# Altium footprint library FS_Footprints.PcbLib: 134 footprints (part 7 of 9)
Each footprint in its own frame and in the unit in brackets; x right, y up, seen from the top. Pads: shape width x height; smd on the part's side, far side on the other; paste and mask are expansions set on the pad; w line width, h text height; cw(c..) or ccw(c..) is an arc to the next point about the centre after c.
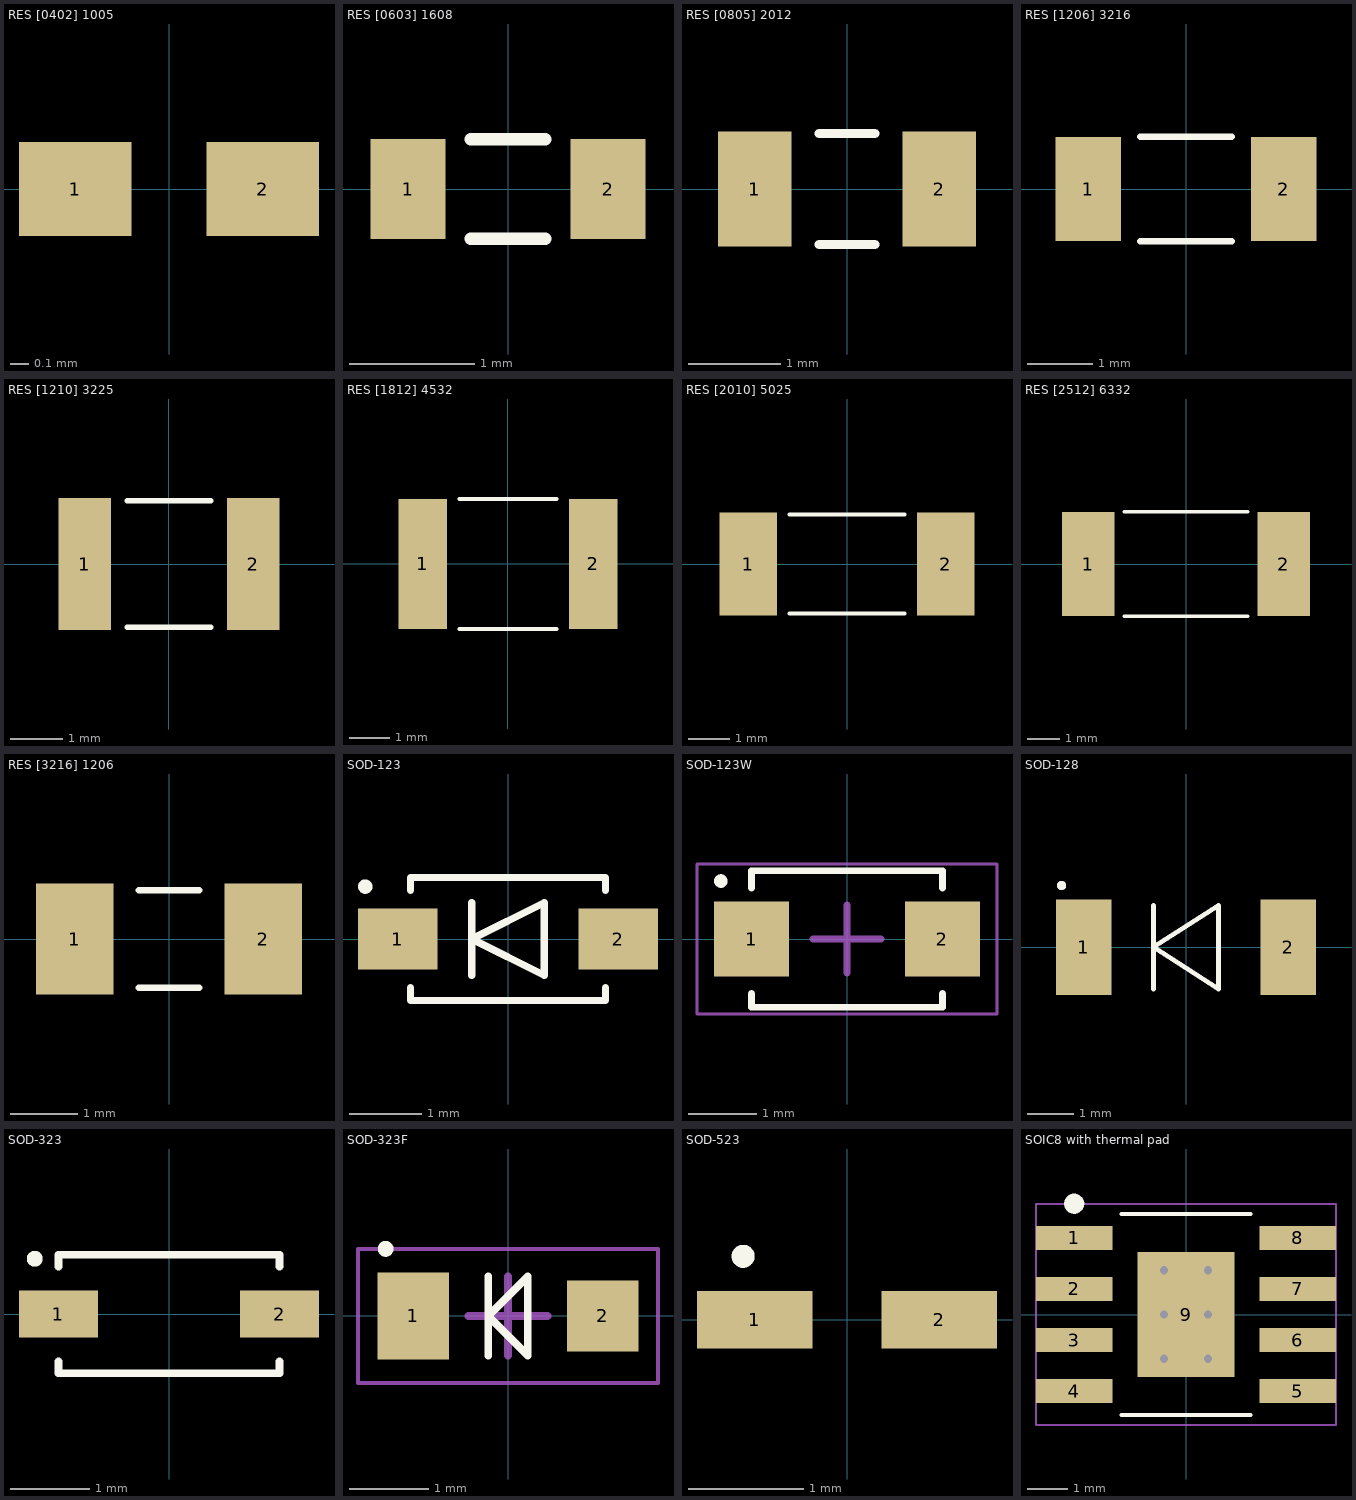
[diagram p6: the footprints below, top view; thin cyan lines are the x and y axes]

## RES [0402] 1005 [mm] "Chip Resistor, 2-Leads, Body 1.00x0.50mm, IPC High Density"
height 0.36
pads (2):
  rect 0.6x0.5 smd: 1(-0.5,0) 2(0.5,0)
3D body "User Library-SMD RESISTOR-0402.step": height 0.35, standoff -0.01, extent -0.5,-0.25 0.5,0.25

## RES [0603] 1608 [mm]
pads (2):
  rect 0.6x0.8 smd: 1(-0.8,0) 2(0.8,0)
Top Overlay:
  lines w0.1: -0.3,-0.4 0.3,-0.4 ; -0.3,0.4 0.3,0.4
3D body "User Library-SMD RESISTOR-0603.step": height 0.46, standoff 0, extent -0.8,-0.4 0.8,0.4

## RES [0805] 2012 [mm]
pads (2):
  rect 0.8x1.25 smd: 1(-1,0) 2(1,0)
Top Overlay:
  lines w0.1: -0.3,-0.6 0.3,-0.6 ; -0.3,0.6 0.3,0.6
3D body "User Library-SMD RESISTOR-0805.step": height 0.6, standoff 0, extent -1,-0.625 1,0.625

## RES [1206] 3216 [mm]
pads (2):
  rect 1x1.6 smd: 1(-1.5,0) 2(1.5,0)
Top Overlay:
  lines w0.1: -0.7,-0.8 0.7,-0.8 ; -0.7,0.8 0.7,0.8
3D body "User Library-SMD RESISTOR-1206.step": height 0.6, standoff 0, extent -1.6,-0.8 1.6,0.8

## RES [1210] 3225 [mm]
pads (2):
  rect 1x2.5 smd: 1(-1.6,0) 2(1.6,0)
Top Overlay:
  lines w0.1: -0.8,-1.2 0.8,-1.2 ; -0.8,1.2 0.8,1.2
3D body "User Library-SMD RESISTOR-1210.step": height 0.6, standoff 0, extent -1.6,-1.25 1.6,1.25

## RES [1812] 4532 [mm]
pads (2):
  rect 1.2x3.2 smd: 1(-2.1,0) 2(2.1,0)
Top Overlay:
  lines w0.1: -1.2,-1.6 1.2,-1.6 ; -1.2,1.6 1.2,1.6
3D body "User Library-SMD RESISTOR-1812.step": height 0.6, standoff 0, extent -2.25,-1.6 2.25,1.6

## RES [2010] 5025 [mm]
pads (2):
  rect 1.4x2.5 smd: 1(-2.4,0) 2(2.4,0)
Top Overlay:
  lines w0.1: -1.4,-1.2 1.4,-1.2 ; -1.4,1.2 1.4,1.2
3D body "User Library-SMD RESISTOR-2010.step": height 0.6, standoff 0, extent -2.5,-1.25 2.5,1.25

## RES [2512] 6332 [mm]
pads (2):
  rect 1.6x3.2 smd: 1(-3,0) 2(3,0)
Top Overlay:
  lines w0.1: -1.9,-1.6 1.9,-1.6 ; -1.9,1.6 1.9,1.6
3D body "User Library-SMD RESISTOR-2512.step": height 0.6, standoff 0, extent -3.2,-1.6 3.2,1.6

## RES [3216] 1206 [mm]
height 1
pads (2):
  rect 1.15x1.65 smd: 1(-1.4,0) 2(1.4,0)
Top Overlay:
  lines w0.1: -0.45,-0.725 0.45,-0.725 ; -0.45,0.725 0.45,0.725
3D body "User Library-res1206-1.step": height 0.55, standoff 0, extent -1.6,-0.8 1.6,0.8

## SOD-123 [mm]
pads (2):
  rect 1.1x0.85 smd: 1(-1.525,0) 2(1.525,0)
Top Overlay:
  circle w0.1: c-1.975,0.725 r0.05
  lines w0.1: -1.35,-0.675 -1.35,-0.85 1.35,-0.85 1.35,-0.675 ; -1.35,0.675 -1.35,0.85 1.35,0.85 1.35,0.675 ; -0.5,-0.5 -0.5,0.5 ; -0.5,0 0.5,-0.5 0.5,0.5 -0.5,0
3D body "User Library-SOD-123_DiodesInc.step": height 1.42, standoff -0.03, extent -1.925,-0.85 1.925,0.85

## SOD-123W [mm] "SODFL, 2-Leads, Body 1.70x3.50mm, IPC Medium Density"
height 1.1
pads (2):
  rect 1.1x1.1 smd: 1(-1.4,0) 2(1.4,0)
Top Overlay:
  circle w0.1: c-1.85,0.85 r0.05
  lines w0.1: -1.4,-0.8 -1.4,-1 1.4,-1 1.4,-0.8 ; -1.4,0.75 -1.4,1 1.4,1 1.4,0.75
Mechanical 15:
  lines w0.05: -2.2,-1.1 2.2,-1.1 2.2,1.1 -2.2,1.1 -2.2,-1.1
  lines w0.1: -0.5,0 0.5,0 ; 0,-0.5 0,0.5
3D body "SOD123W.step": height 1.1, standoff 0, extent -1.75,-0.95 1.75,0.95

## SOD-128 [mm] "SODFL, 2-Leads, Body 2.70x5.00mm, IPC Medium Density"
height 1.2
pads (2):
  rect 1.2x2.05 smd: 1(-2.2,0) 2(2.2,0)
Top Overlay:
  circle w0.1: c-2.675,1.325 r0.05
  lines w0.1: -0.7,-0.9 -0.7,0.9 ; -0.7,0 0.7,-0.9 0.7,0.9 -0.7,0
3D body "User Library-SOD-128 ST214 model.step": height 1.11, standoff 0, extent -2.6,-1.35 2.6,1.35

## SOD-323 [mm]
height 1.1
pads (2):
  rect 1x0.6 smd: 1(-1.4,0) 2(1.4,0)
Top Overlay:
  circle w0.1: c-1.7,0.7 r0.05
  lines w0.1: -1.4,-0.6 -1.4,-0.75 1.4,-0.75 1.4,-0.6 ; -1.4,0.6 -1.4,0.75 1.4,0.75 1.4,0.6
3D body "User Library-SOD-323.step": height 1.1, standoff 0, extent -1.3,-0.675 1.3,0.675

## SOD-323F [mm] "SODFL, 2-Leads, Body 1.25x2.50mm, IPC Medium Density"
height 0.8
pads (2):
  rect 0.9x1.1 smd: 1(-1.2,0)
  rect 0.9x0.9 smd: 2(1.2,0)
Top Overlay:
  circle w0.1: c-1.55,0.85 r0.05
  lines w0.1: -0.25,-0.5 -0.25,0.5 ; -0.25,0 0.25,-0.5 0.25,0.5 -0.25,0
Mechanical 15:
  lines w0.05: -1.9,-0.85 -1.9,0.85 1.9,0.85 1.9,-0.85 -1.9,-0.85
  lines w0.1: -0.5,0 0.5,0 ; 0,-0.5 0,0.5
3D body "SOD-323F.step": height 0.8, standoff 0, extent -1.25,-0.675 1.25,0.675

## SOD-523 [mm] "Molded Diode, 2-Leads, Body 1,20x0,80mm, IPC Medium Density"
height 0.65
pads (2):
  rect 1x0.5 smd: 1(-0.8,0) 2(0.8,0)
Top Overlay:
  circle w0.1: c-0.9,0.55 r0.05
3D body "User Library-SOD523.step": height 0.71, standoff 0, extent -0.915,-0.424 0.915,0.425

## SOIC8 with thermal pad [mm] "SOIC, 8-Leads, Body 4.90x3.90mm, Pitch 1.27mm, Thermal Pad 3.10x2.41mm, IPC Medium Density"
height 1.68
pads (9):
  rect 1.9x0.6 smd: 1(-2.78,1.905) 2(-2.78,0.635) 3(-2.78,-0.635) 4(-2.78,-1.905) 5(2.78,-1.905) 6(2.78,-0.635) 7(2.78,0.635) 8(2.78,1.905)
  rect 2.41x3.1 smd: 9(0,0)
via -0.55,1.1 diameter 0.5 hole 0.2
via 0.55,1.1 diameter 0.5 hole 0.2
via -0.55,0 diameter 0.5 hole 0.2
via 0.55,0 diameter 0.5 hole 0.2
via -0.55,-1.1 diameter 0.5 hole 0.2
via 0.55,-1.1 diameter 0.5 hole 0.2
Top Overlay:
  circle w0.25: c-2.78,2.755 r0.125
  lines w0.1: -1.6,-2.5 1.6,-2.5 ; -1.6,2.5 1.6,2.5
Mechanical 15:
  lines w0.05: -3.725,-2.75 -3.725,2.75 3.725,2.75 3.725,-2.75 -3.725,-2.75
  lines w0.1: -0.5,0 0.5,0 ; 0,-0.5 0,0.5
3D body "SOIC8 with thermal pad.step": height 1.68, standoff 0, extent -3.01,-2.5 3.01,2.5